# Altium schematic symbol library jlcpcb_2025_04_inductors_extended_0805.schlib: 882 symbols (part 1 of 5)
Pins are listed as number, name and electrical type; pins without a type are passive.

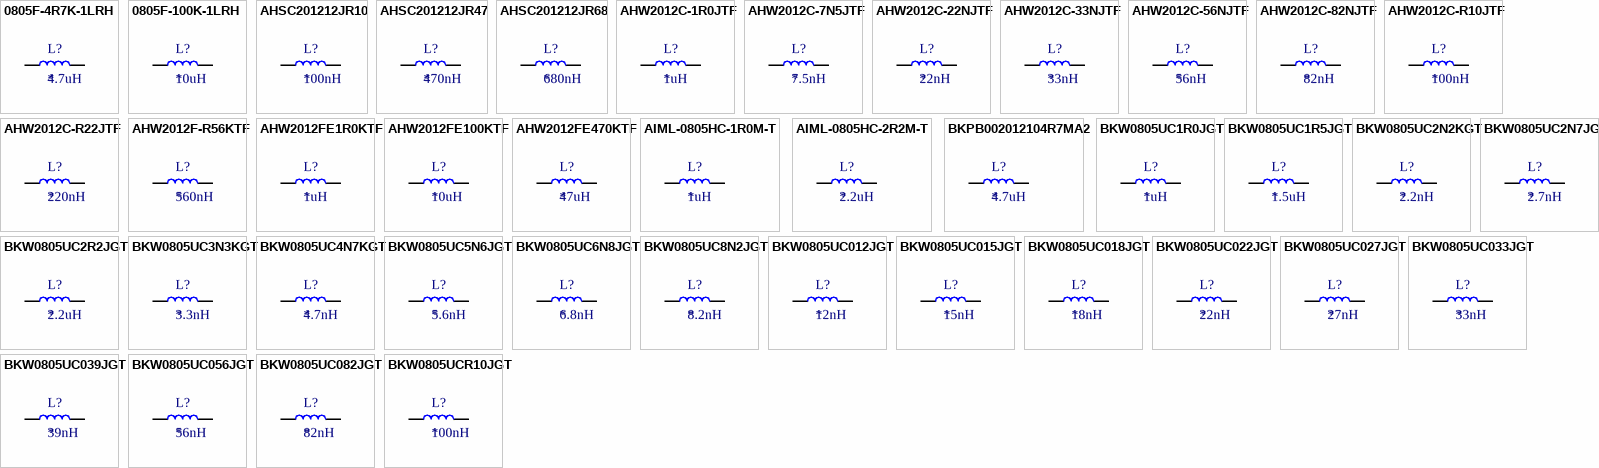
[diagram p0: symbols 0805F-4R7K-1LRH to BKW0805UCR10JGT]

## 0805F-4R7K-1LRH
designator L?  Inductance: 4.7uH
Inductor, 4.7uH, ±10%, 1.87Ω, 280mA, SMD 0805; Manufacturer: PSA(Prosperity Dielectrics); Manufacturer Part Number: 0805F-4R7K-1LRH; Package Size: 0805; JLCPCB Basic Part: No; JLCPCB Part Number: C329433; Supplier 1: LCSC; Category: Inductors; Supplier Part Number 1: C329433; Tolerance: ±10%; Rated Current: 280mA; DC Resistance: 1.87Ω; RoHS: Yes; ComponentLink1Description: Datasheet; ComponentLink1URL: https://wmsc.lcsc.com/wmsc/upload/file/pdf/v2/lcsc/1811151436_PSA-Prosperity-Dielectrics-0805F-4R7K-1LRH_C329433.pdf; ComponentLink2Description: JLCPCB Part URL; ComponentLink2URL: https://jlcpcb.com/partdetail/C329433; ComponentLink3Description: LCSC Part URL; ComponentLink3URL: https://lcsc.com/product-detail/Inductors-SMD_PSAProsperity-Dielectrics-PSAProsperity-Dielectrics-0805F-4R7K-1LRH_C329433.html
footprint IND-0805 (0805 (2012M) Inductor)
pins: 1, 2

## 0805F-100K-1LRH
designator L?  Inductance: 10uH
Inductor, 10uH, ±10%, 3.45Ω, 200mA, SMD 0805; Manufacturer: PSA(Prosperity Dielectrics); Manufacturer Part Number: 0805F-100K-1LRH; Package Size: 0805; JLCPCB Basic Part: No; JLCPCB Part Number: C329432; Supplier 1: LCSC; Category: Inductors; Supplier Part Number 1: C329432; Tolerance: ±10%; Rated Current: 200mA; DC Resistance: 3.45Ω; RoHS: Yes; ComponentLink1Description: Datasheet; ComponentLink1URL: https://wmsc.lcsc.com/wmsc/upload/file/pdf/v2/lcsc/2304140030_PSA-Prosperity-Dielectrics-0805F-100K-1LRH_C329432.pdf; ComponentLink2Description: JLCPCB Part URL; ComponentLink2URL: https://jlcpcb.com/partdetail/C329432; ComponentLink3Description: LCSC Part URL; ComponentLink3URL: https://lcsc.com/product-detail/Inductors-SMD_PSAProsperity-Dielectrics-PSAProsperity-Dielectrics-0805F-100K-1LRH_C329432.html
footprint IND-0805 (0805 (2012M) Inductor)
pins: 1, 2

## AHSC201212JR10
designator L?  Inductance: 100nH
Inductor, 100nH, ±5%, 460mΩ, 400mA, SMD 0805; Manufacturer: COILANK INTERNATIONAL; Manufacturer Part Number: AHSC201212JR10; Self-Resonant Frequency: 1.2GHz; Q Factor: 65@500MHz; Package Size: 0805; JLCPCB Basic Part: No; JLCPCB Part Number: C561731; Supplier 1: LCSC; Category: Inductors; Supplier Part Number 1: C561731; Tolerance: ±5%; Rated Current: 400mA; DC Resistance: 460mΩ; RoHS: Yes; ComponentLink1Description: Datasheet; ComponentLink1URL: https://wmsc.lcsc.com/wmsc/upload/file/pdf/v2/lcsc/2006231007_COILANK-INTERNATIONAL-AHSC201212JR10_C561731.pdf; ComponentLink2Description: JLCPCB Part URL; ComponentLink2URL: https://jlcpcb.com/partdetail/C561731; ComponentLink3Description: LCSC Part URL; ComponentLink3URL: https://lcsc.com/product-detail/Inductors-SMD_COILANK-INTERNATIONAL-COILANK-INTERNATIONAL-AHSC201212JR10_C561731.html
footprint IND-0805 (0805 (2012M) Inductor)
pins: 1, 2

## AHSC201212JR47
designator L?  Inductance: 470nH
Inductor, 470nH, ±5%, 1.76Ω, 250mA, SMD 0805; Manufacturer: COILANK INTERNATIONAL; Manufacturer Part Number: AHSC201212JR47; Self-Resonant Frequency: 375MHz; Q Factor: 30@100MHz; Package Size: 0805; JLCPCB Basic Part: No; JLCPCB Part Number: C561732; Supplier 1: LCSC; Category: Inductors; Supplier Part Number 1: C561732; Tolerance: ±5%; Rated Current: 250mA; DC Resistance: 1.76Ω; RoHS: Yes; ComponentLink1Description: Datasheet; ComponentLink1URL: https://wmsc.lcsc.com/wmsc/upload/file/pdf/v2/lcsc/2006231007_COILANK-INTERNATIONAL-AHSC201212JR47_C561732.pdf; ComponentLink2Description: JLCPCB Part URL; ComponentLink2URL: https://jlcpcb.com/partdetail/C561732; ComponentLink3Description: LCSC Part URL; ComponentLink3URL: https://lcsc.com/product-detail/Inductors-SMD_COILANK-INTERNATIONAL-COILANK-INTERNATIONAL-AHSC201212JR47_C561732.html
footprint IND-0805 (0805 (2012M) Inductor)
pins: 1, 2

## AHSC201212JR68
designator L?  Inductance: 680nH
Inductor, 680nH, ±5%, 2.2Ω, 190mA, SMD 0805; Manufacturer: COILANK INTERNATIONAL; Manufacturer Part Number: AHSC201212JR68; Self-Resonant Frequency: 188MHz; Q Factor: 23@50MHz; Package Size: 0805; JLCPCB Basic Part: No; JLCPCB Part Number: C561733; Supplier 1: LCSC; Category: Inductors; Supplier Part Number 1: C561733; Tolerance: ±5%; Rated Current: 190mA; DC Resistance: 2.2Ω; RoHS: Yes; ComponentLink1Description: Datasheet; ComponentLink1URL: https://wmsc.lcsc.com/wmsc/upload/file/pdf/v2/lcsc/2006231007_COILANK-INTERNATIONAL-AHSC201212JR68_C561733.pdf; ComponentLink2Description: JLCPCB Part URL; ComponentLink2URL: https://jlcpcb.com/partdetail/C561733; ComponentLink3Description: LCSC Part URL; ComponentLink3URL: https://lcsc.com/product-detail/Inductors-SMD_COILANK-INTERNATIONAL-COILANK-INTERNATIONAL-AHSC201212JR68_C561733.html
footprint IND-0805 (0805 (2012M) Inductor)
pins: 1, 2

## AHW2012C-1R0JTF
designator L?  Inductance: 1uH
Inductor, 1uH, ±5%, 2.5Ω, 170mA, SMD 0805; Manufacturer: APV; Manufacturer Part Number: AHW2012C-1R0JTF; Self-Resonant Frequency: 220MHz; Q Factor: 20@50MHz; Package Size: 0805; JLCPCB Basic Part: No; JLCPCB Part Number: C6808030; Supplier 1: LCSC; Category: Inductors; Supplier Part Number 1: C6808030; Tolerance: ±5%; Rated Current: 170mA; DC Resistance: 2.5Ω; RoHS: Yes; ComponentLink1Description: Datasheet; ComponentLink1URL: https://wmsc.lcsc.com/wmsc/upload/file/pdf/v2/lcsc/2306211549_APV-AHW2012C-1R0JTF_C6808030.pdf; ComponentLink2Description: JLCPCB Part URL; ComponentLink2URL: https://jlcpcb.com/partdetail/C6808030; ComponentLink3Description: LCSC Part URL; ComponentLink3URL: https://lcsc.com/product-detail/Inductors-SMD_APV-APV-AHW2012C-1R0JTF_C6808030.html
footprint IND-0805 (0805 (2012M) Inductor)
pins: 1, 2

## AHW2012C-7N5JTF
designator L?  Inductance: 7.5nH
Inductor, 7.5nH, ±5%, 140mΩ, 600mA, SMD 0805; Manufacturer: APV; Manufacturer Part Number: AHW2012C-7N5JTF; Self-Resonant Frequency: 4.8GHz; Q Factor: 50@1GHz; Package Size: 0805; JLCPCB Basic Part: No; JLCPCB Part Number: C6808045; Supplier 1: LCSC; Category: Inductors; Supplier Part Number 1: C6808045; Tolerance: ±5%; Rated Current: 600mA; DC Resistance: 140mΩ; RoHS: Yes; ComponentLink1Description: Datasheet; ComponentLink1URL: https://wmsc.lcsc.com/wmsc/upload/file/pdf/v2/lcsc/2306211549_APV-AHW2012C-7N5JTF_C6808045.pdf; ComponentLink2Description: JLCPCB Part URL; ComponentLink2URL: https://jlcpcb.com/partdetail/C6808045; ComponentLink3Description: LCSC Part URL; ComponentLink3URL: https://lcsc.com/product-detail/Inductors-SMD_APV-APV-AHW2012C-7N5JTF_C6808045.html
footprint IND-0805 (0805 (2012M) Inductor)
pins: 1, 2

## AHW2012C-22NJTF
designator L?  Inductance: 22nH
Inductor, 22nH, ±5%, 220mΩ, 500mA, SMD 0805; Manufacturer: APV; Manufacturer Part Number: AHW2012C-22NJTF; Self-Resonant Frequency: 2.6GHz; Q Factor: 55@500MHz; Package Size: 0805; JLCPCB Basic Part: No; JLCPCB Part Number: C6808033; Supplier 1: LCSC; Category: Inductors; Supplier Part Number 1: C6808033; Tolerance: ±5%; Rated Current: 500mA; DC Resistance: 220mΩ; RoHS: Yes; ComponentLink1Description: Datasheet; ComponentLink1URL: https://wmsc.lcsc.com/wmsc/upload/file/pdf/v2/lcsc/2306211549_APV-AHW2012C-22NJTF_C6808033.pdf; ComponentLink2Description: JLCPCB Part URL; ComponentLink2URL: https://jlcpcb.com/partdetail/C6808033; ComponentLink3Description: LCSC Part URL; ComponentLink3URL: https://lcsc.com/product-detail/Inductors-SMD_APV-APV-AHW2012C-22NJTF_C6808033.html
footprint IND-0805 (0805 (2012M) Inductor)
pins: 1, 2

## AHW2012C-33NJTF
designator L?  Inductance: 33nH
Inductor, 33nH, ±5%, 270mΩ, 500mA, SMD 0805; Manufacturer: APV; Manufacturer Part Number: AHW2012C-33NJTF; Self-Resonant Frequency: 2.15GHz; Q Factor: 60@500MHz; Package Size: 0805; JLCPCB Basic Part: No; JLCPCB Part Number: C6808037; Supplier 1: LCSC; Category: Inductors; Supplier Part Number 1: C6808037; Tolerance: ±5%; Rated Current: 500mA; DC Resistance: 270mΩ; RoHS: Yes; ComponentLink1Description: Datasheet; ComponentLink1URL: https://wmsc.lcsc.com/wmsc/upload/file/pdf/v2/lcsc/2306211549_APV-AHW2012C-33NJTF_C6808037.pdf; ComponentLink2Description: JLCPCB Part URL; ComponentLink2URL: https://jlcpcb.com/partdetail/C6808037; ComponentLink3Description: LCSC Part URL; ComponentLink3URL: https://lcsc.com/product-detail/Inductors-SMD_APV-APV-AHW2012C-33NJTF_C6808037.html
footprint IND-0805 (0805 (2012M) Inductor)
pins: 1, 2

## AHW2012C-56NJTF
designator L?  Inductance: 56nH
Inductor, 56nH, ±5%, 340mΩ, 500mA, SMD 0805; Manufacturer: APV; Manufacturer Part Number: AHW2012C-56NJTF; Self-Resonant Frequency: 1.6GHz; Q Factor: 60@500MHz; Package Size: 0805; JLCPCB Basic Part: No; JLCPCB Part Number: C6808040; Supplier 1: LCSC; Category: Inductors; Supplier Part Number 1: C6808040; Tolerance: ±5%; Rated Current: 500mA; DC Resistance: 340mΩ; RoHS: Yes; ComponentLink1Description: Datasheet; ComponentLink1URL: https://wmsc.lcsc.com/wmsc/upload/file/pdf/v2/lcsc/2306211549_APV-AHW2012C-56NJTF_C6808040.pdf; ComponentLink2Description: JLCPCB Part URL; ComponentLink2URL: https://jlcpcb.com/partdetail/C6808040; ComponentLink3Description: LCSC Part URL; ComponentLink3URL: https://lcsc.com/product-detail/Inductors-SMD_APV-APV-AHW2012C-56NJTF_C6808040.html
footprint IND-0805 (0805 (2012M) Inductor)
pins: 1, 2

## AHW2012C-82NJTF
designator L?  Inductance: 82nH
Inductor, 82nH, ±5%, 420mΩ, 400mA, SMD 0805; Manufacturer: APV; Manufacturer Part Number: AHW2012C-82NJTF; Self-Resonant Frequency: 1.33GHz; Q Factor: 65@500MHz; Package Size: 0805; JLCPCB Basic Part: No; JLCPCB Part Number: C6364713; Supplier 1: LCSC; Category: Inductors; Supplier Part Number 1: C6364713; Tolerance: ±5%; Rated Current: 400mA; DC Resistance: 420mΩ; RoHS: Yes; ComponentLink1Description: Datasheet; ComponentLink1URL: https://wmsc.lcsc.com/wmsc/upload/file/pdf/v2/lcsc/2305231105_APV-AHW2012C-82NJTF_C6364713.pdf; ComponentLink2Description: JLCPCB Part URL; ComponentLink2URL: https://jlcpcb.com/partdetail/C6364713; ComponentLink3Description: LCSC Part URL; ComponentLink3URL: https://lcsc.com/product-detail/Inductors-SMD_APV-APV-AHW2012C-82NJTF_C6364713.html
footprint IND-0805 (0805 (2012M) Inductor)
pins: 1, 2

## AHW2012C-R10JTF
designator L?  Inductance: 100nH
Inductor, 100nH, ±5%, 460mΩ, 400mA, SMD 0805; Manufacturer: APV; Manufacturer Part Number: AHW2012C-R10JTF; Self-Resonant Frequency: 1.25GHz; Q Factor: 65@500MHz; Package Size: 0805; JLCPCB Basic Part: No; JLCPCB Part Number: C6808047; Supplier 1: LCSC; Category: Inductors; Supplier Part Number 1: C6808047; Tolerance: ±5%; Rated Current: 400mA; DC Resistance: 460mΩ; RoHS: Yes; ComponentLink1Description: Datasheet; ComponentLink1URL: https://wmsc.lcsc.com/wmsc/upload/file/pdf/v2/lcsc/2306211549_APV-AHW2012C-R10JTF_C6808047.pdf; ComponentLink2Description: JLCPCB Part URL; ComponentLink2URL: https://jlcpcb.com/partdetail/C6808047; ComponentLink3Description: LCSC Part URL; ComponentLink3URL: https://lcsc.com/product-detail/Inductors-SMD_APV-APV-AHW2012C-R10JTF_C6808047.html
footprint IND-0805 (0805 (2012M) Inductor)
pins: 1, 2

## AHW2012C-R22JTF
designator L?  Inductance: 220nH
Inductor, 220nH, ±5%, 700mΩ, 400mA, SMD 0805; Manufacturer: APV; Manufacturer Part Number: AHW2012C-R22JTF; Self-Resonant Frequency: 820MHz; Q Factor: 50@250MHz; Package Size: 0805; JLCPCB Basic Part: No; JLCPCB Part Number: C6808051; Supplier 1: LCSC; Category: Inductors; Supplier Part Number 1: C6808051; Tolerance: ±5%; Rated Current: 400mA; DC Resistance: 700mΩ; RoHS: Yes; ComponentLink1Description: Datasheet; ComponentLink1URL: https://wmsc.lcsc.com/wmsc/upload/file/pdf/v2/lcsc/2306211549_APV-AHW2012C-R22JTF_C6808051.pdf; ComponentLink2Description: JLCPCB Part URL; ComponentLink2URL: https://jlcpcb.com/partdetail/C6808051; ComponentLink3Description: LCSC Part URL; ComponentLink3URL: https://lcsc.com/product-detail/Inductors-SMD_APV-APV-AHW2012C-R22JTF_C6808051.html
footprint IND-0805 (0805 (2012M) Inductor)
pins: 1, 2

## AHW2012F-R56KTF
designator L?  Inductance: 560nH
Inductor, 560nH, ±10%, 460mΩ, 400mA, SMD 0805; Manufacturer: APV; Manufacturer Part Number: AHW2012F-R56KTF; Self-Resonant Frequency: 400MHz; Q Factor: 12; Package Size: 0805; JLCPCB Basic Part: No; JLCPCB Part Number: C6808062; Supplier 1: LCSC; Category: Inductors; Supplier Part Number 1: C6808062; Tolerance: ±10%; Rated Current: 400mA; DC Resistance: 460mΩ; RoHS: Yes; ComponentLink1Description: Datasheet; ComponentLink1URL: https://wmsc.lcsc.com/wmsc/upload/file/pdf/v2/lcsc/2306211549_APV-AHW2012F-R56KTF_C6808062.pdf; ComponentLink2Description: JLCPCB Part URL; ComponentLink2URL: https://jlcpcb.com/partdetail/C6808062; ComponentLink3Description: LCSC Part URL; ComponentLink3URL: https://lcsc.com/product-detail/Inductors-SMD_APV-APV-AHW2012F-R56KTF_C6808062.html
footprint IND-0805 (0805 (2012M) Inductor)
pins: 1, 2

## AHW2012FE1R0KTF
designator L?  Inductance: 1uH
Inductor, 1uH, ±10%, 169mΩ, 1.35A, SMD 0805; Manufacturer: APV; Manufacturer Part Number: AHW2012FE1R0KTF; Self-Resonant Frequency: 208MHz; Q Factor: 14; Package Size: 0805; JLCPCB Basic Part: No; JLCPCB Part Number: C6364732; Supplier 1: LCSC; Category: Inductors; Supplier Part Number 1: C6364732; Tolerance: ±10%; Rated Current: 1.35A; DC Resistance: 169mΩ; RoHS: Yes; ComponentLink1Description: Datasheet; ComponentLink1URL: https://wmsc.lcsc.com/wmsc/upload/file/pdf/v2/lcsc/2308041746_APV-AHW2012FE1R0KTF_C6364732.pdf; ComponentLink2Description: JLCPCB Part URL; ComponentLink2URL: https://jlcpcb.com/partdetail/C6364732; ComponentLink3Description: LCSC Part URL; ComponentLink3URL: https://lcsc.com/product-detail/Inductors-SMD_APV-APV-AHW2012FE1R0KTF_C6364732.html
footprint IND-0805 (0805 (2012M) Inductor)
pins: 1, 2

## AHW2012FE100KTF
designator L?  Inductance: 10uH
Inductor, 10uH, ±10%, 1.17Ω, 560mA, SMD 0805; Manufacturer: APV; Manufacturer Part Number: AHW2012FE100KTF; Self-Resonant Frequency: 25MHz; Q Factor: 14; Package Size: 0805; JLCPCB Basic Part: No; JLCPCB Part Number: C6364730; Supplier 1: LCSC; Category: Inductors; Supplier Part Number 1: C6364730; Tolerance: ±10%; Rated Current: 560mA; DC Resistance: 1.17Ω; RoHS: Yes; ComponentLink1Description: Datasheet; ComponentLink1URL: https://wmsc.lcsc.com/wmsc/upload/file/pdf/v2/lcsc/2308041746_APV-AHW2012FE100KTF_C6364730.pdf; ComponentLink2Description: JLCPCB Part URL; ComponentLink2URL: https://jlcpcb.com/partdetail/C6364730; ComponentLink3Description: LCSC Part URL; ComponentLink3URL: https://lcsc.com/product-detail/Inductors-SMD_APV-APV-AHW2012FE100KTF_C6364730.html
footprint IND-0805 (0805 (2012M) Inductor)
pins: 1, 2

## AHW2012FE470KTF
designator L?  Inductance: 47uH
Inductor, 47uH, ±10%, 4.42Ω, 280mA, SMD 0805; Manufacturer: APV; Manufacturer Part Number: AHW2012FE470KTF; Self-Resonant Frequency: 15MHz; Q Factor: 14; Package Size: 0805; JLCPCB Basic Part: No; JLCPCB Part Number: C6364735; Supplier 1: LCSC; Category: Inductors; Supplier Part Number 1: C6364735; Tolerance: ±10%; Rated Current: 280mA; DC Resistance: 4.42Ω; RoHS: Yes; ComponentLink1Description: Datasheet; ComponentLink1URL: https://wmsc.lcsc.com/wmsc/upload/file/pdf/v2/lcsc/2308041746_APV-AHW2012FE470KTF_C6364735.pdf; ComponentLink2Description: JLCPCB Part URL; ComponentLink2URL: https://jlcpcb.com/partdetail/C6364735; ComponentLink3Description: LCSC Part URL; ComponentLink3URL: https://lcsc.com/product-detail/Inductors-SMD_APV-APV-AHW2012FE470KTF_C6364735.html
footprint IND-0805 (0805 (2012M) Inductor)
pins: 1, 2

## AIML-0805HC-1R0M-T
designator L?  Inductance: 1uH
Inductor, 1uH, ±20%, 150mΩ, SMD 0805; Manufacturer: Abracon LLC; Manufacturer Part Number: AIML-0805HC-1R0M-T; Saturation Current: 400mA; Self-Resonant Frequency: 75MHz; Package Size: 0805; JLCPCB Basic Part: No; JLCPCB Part Number: C2044214; Supplier 1: LCSC; Category: Inductors; Supplier Part Number 1: C2044214; Tolerance: ±20%; DC Resistance: 150mΩ; RoHS: Yes; ComponentLink1Description: Datasheet; ComponentLink1URL: https://wmsc.lcsc.com/wmsc/upload/file/pdf/v2/lcsc/2304140030_Abracon-LLC-AIML-0805HC-1R0M-T_C2044214.pdf; ComponentLink2Description: JLCPCB Part URL; ComponentLink2URL: https://jlcpcb.com/partdetail/C2044214; ComponentLink3Description: LCSC Part URL; ComponentLink3URL: https://lcsc.com/product-detail/Inductors-SMD_Abracon-LLC-Abracon-LLC-AIML-0805HC-1R0M-T_C2044214.html
footprint IND-0805 (0805 (2012M) Inductor)
pins: 1, 2

## AIML-0805HC-2R2M-T
designator L?  Inductance: 2.2uH
Inductor, 2.2uH, ±20%, 200mΩ, 1.2A, SMD 0805; Manufacturer: Abracon LLC; Manufacturer Part Number: AIML-0805HC-2R2M-T; Saturation Current: 150mA; Self-Resonant Frequency: 50MHz; Package Size: 0805; JLCPCB Basic Part: No; JLCPCB Part Number: C193676; Supplier 1: LCSC; Category: Inductors; Supplier Part Number 1: C193676; Tolerance: ±20%; Rated Current: 1.2A; DC Resistance: 200mΩ; RoHS: Yes; ComponentLink1Description: Datasheet; ComponentLink1URL: https://wmsc.lcsc.com/wmsc/upload/file/pdf/v2/lcsc/1809291530_Abracon-LLC-AIML-0805HC-2R2M-T_C193676.pdf; ComponentLink2Description: JLCPCB Part URL; ComponentLink2URL: https://jlcpcb.com/partdetail/C193676; ComponentLink3Description: LCSC Part URL; ComponentLink3URL: https://lcsc.com/product-detail/Inductors-SMD_Abracon-LLC-Abracon-LLC-AIML-0805HC-2R2M-T_C193676.html
footprint IND-0805 (0805 (2012M) Inductor)
pins: 1, 2

## BKPB002012104R7MA2
designator L?  Inductance: 4.7uH
Inductor, 4.7uH, ±20%, SMD 0805; Manufacturer: Chilisin Elec; Manufacturer Part Number: BKPB002012104R7MA2; Package Size: 0805; JLCPCB Basic Part: No; JLCPCB Part Number: C2981203; Supplier 1: LCSC; Category: Inductors; Supplier Part Number 1: C2981203; Tolerance: ±20%; RoHS: Yes; ComponentLink1Description: Datasheet; ComponentLink1URL: https://wmsc.lcsc.com/wmsc/upload/file/pdf/v2/lcsc/2203101903_Chilisin-Elec-BKPB002012104R7MA2_C2981203.pdf; ComponentLink2Description: JLCPCB Part URL; ComponentLink2URL: https://jlcpcb.com/partdetail/C2981203; ComponentLink3Description: LCSC Part URL; ComponentLink3URL: https://lcsc.com/product-detail/Inductors-SMD_Chilisin-Elec-Chilisin-Elec-BKPB002012104R7MA2_C2981203.html
footprint IND-0805 (0805 (2012M) Inductor)
pins: 1, 2

## BKW0805UC1R0JGT
designator L?  Inductance: 1uH
Inductor, 1uH, ±5%, 2.4Ω, 170mA, SMD 0805; Manufacturer: FH-BK(Guangdong Fenghua Bangke Elec); Manufacturer Part Number: BKW0805UC1R0JGT; Package Size: 0805; JLCPCB Basic Part: No; JLCPCB Part Number: C98537; Supplier 1: LCSC; Category: Inductors; Supplier Part Number 1: C98537; Tolerance: ±5%; Rated Current: 170mA; DC Resistance: 2.4Ω; RoHS: Yes; ComponentLink1Description: Datasheet; ComponentLink1URL: https://wmsc.lcsc.com/wmsc/upload/file/pdf/v2/lcsc/2304140030_FH-BK-Guangdong-Fenghua-Bangke-Elec-BKW0805UC1R0JGT_C98537.pdf; ComponentLink2Description: JLCPCB Part URL; ComponentLink2URL: https://jlcpcb.com/partdetail/C98537; ComponentLink3Description: LCSC Part URL; ComponentLink3URL: https://lcsc.com/product-detail/Inductors-SMD_FH-BKGuangdong-Fenghua-Bangke-Elec-FH-BKGuangdong-Fenghua-Bangke-Elec-BKW0805UC1R0JGT_C98537.html
footprint IND-0805 (0805 (2012M) Inductor)
pins: 1, 2

## BKW0805UC1R5JGT
designator L?  Inductance: 1.5uH
Inductor, 1.5uH, ±5%, 2.8Ω, 160mA, SMD 0805; Manufacturer: FH-BK(Guangdong Fenghua Bangke Elec); Manufacturer Part Number: BKW0805UC1R5JGT; Package Size: 0805; JLCPCB Basic Part: No; JLCPCB Part Number: C147306; Supplier 1: LCSC; Category: Inductors; Supplier Part Number 1: C147306; Tolerance: ±5%; Rated Current: 160mA; DC Resistance: 2.8Ω; RoHS: Yes; ComponentLink1Description: Datasheet; ComponentLink1URL: https://wmsc.lcsc.com/wmsc/upload/file/pdf/v2/lcsc/2304140030_FH-BK-Guangdong-Fenghua-Bangke-Elec-BKW0805UC1R5JGT_C147306.pdf; ComponentLink2Description: JLCPCB Part URL; ComponentLink2URL: https://jlcpcb.com/partdetail/C147306; ComponentLink3Description: LCSC Part URL; ComponentLink3URL: https://lcsc.com/product-detail/Inductors-SMD_FH-BKGuangdong-Fenghua-Bangke-Elec-FH-BKGuangdong-Fenghua-Bangke-Elec-BKW0805UC1R5JGT_C147306.html
footprint IND-0805 (0805 (2012M) Inductor)
pins: 1, 2

## BKW0805UC2N2KGT
designator L?  Inductance: 2.2nH
Inductor, 2.2nH, ±10%, 30mΩ, 800mA, SMD 0805; Manufacturer: FH-BK(Guangdong Fenghua Bangke Elec); Manufacturer Part Number: BKW0805UC2N2KGT; Package Size: 0805; JLCPCB Basic Part: No; JLCPCB Part Number: C316241; Supplier 1: LCSC; Category: Inductors; Supplier Part Number 1: C316241; Tolerance: ±10%; Rated Current: 800mA; DC Resistance: 30mΩ; RoHS: Yes; ComponentLink1Description: Datasheet; ComponentLink1URL: https://wmsc.lcsc.com/wmsc/upload/file/pdf/v2/lcsc/2304140030_FH-BK-Guangdong-Fenghua-Bangke-Elec-BKW0805UC2N2KGT_C316241.pdf; ComponentLink2Description: JLCPCB Part URL; ComponentLink2URL: https://jlcpcb.com/partdetail/C316241; ComponentLink3Description: LCSC Part URL; ComponentLink3URL: https://lcsc.com/product-detail/Inductors-SMD_FH-BKGuangdong-Fenghua-Bangke-Elec-FH-BKGuangdong-Fenghua-Bangke-Elec-BKW0805UC2N2KGT_C316241.html
footprint IND-0805 (0805 (2012M) Inductor)
pins: 1, 2

## BKW0805UC2N7JGT
designator L?  Inductance: 2.7nH
Inductor, 2.7nH, ±5%, 45mΩ, 800mA, SMD 0805; Manufacturer: FH-BK(Guangdong Fenghua Bangke Elec); Manufacturer Part Number: BKW0805UC2N7JGT; Package Size: 0805; JLCPCB Basic Part: No; JLCPCB Part Number: C98530; Supplier 1: LCSC; Category: Inductors; Supplier Part Number 1: C98530; Tolerance: ±5%; Rated Current: 800mA; DC Resistance: 45mΩ; RoHS: Yes; ComponentLink1Description: Datasheet; ComponentLink1URL: https://wmsc.lcsc.com/wmsc/upload/file/pdf/v2/lcsc/2304140030_FH-BK-Guangdong-Fenghua-Bangke-Elec-BKW0805UC2N7JGT_C98530.pdf; ComponentLink2Description: JLCPCB Part URL; ComponentLink2URL: https://jlcpcb.com/partdetail/C98530; ComponentLink3Description: LCSC Part URL; ComponentLink3URL: https://lcsc.com/product-detail/Inductors-SMD_FH-BKGuangdong-Fenghua-Bangke-Elec-FH-BKGuangdong-Fenghua-Bangke-Elec-BKW0805UC2N7JGT_C98530.html
footprint IND-0805 (0805 (2012M) Inductor)
pins: 1, 2

## BKW0805UC2R2JGT
designator L?  Inductance: 2.2uH
Inductor, 2.2uH, ±5%, 4.2Ω, 150mA, SMD 0805; Manufacturer: FH-BK(Guangdong Fenghua Bangke Elec); Manufacturer Part Number: BKW0805UC2R2JGT; Package Size: 0805; JLCPCB Basic Part: No; JLCPCB Part Number: C361664; Supplier 1: LCSC; Category: Inductors; Supplier Part Number 1: C361664; Tolerance: ±5%; Rated Current: 150mA; DC Resistance: 4.2Ω; RoHS: Yes; ComponentLink1Description: Datasheet; ComponentLink1URL: https://wmsc.lcsc.com/wmsc/upload/file/pdf/v2/lcsc/2304140030_FH-BK-Guangdong-Fenghua-Bangke-Elec-BKW0805UC2R2JGT_C361664.pdf; ComponentLink2Description: JLCPCB Part URL; ComponentLink2URL: https://jlcpcb.com/partdetail/C361664; ComponentLink3Description: LCSC Part URL; ComponentLink3URL: https://lcsc.com/product-detail/Inductors-SMD_FH-BKGuangdong-Fenghua-Bangke-Elec-FH-BKGuangdong-Fenghua-Bangke-Elec-BKW0805UC2R2JGT_C361664.html
footprint IND-0805 (0805 (2012M) Inductor)
pins: 1, 2

## BKW0805UC3N3KGT
designator L?  Inductance: 3.3nH
Inductor, 3.3nH, ±10%, 90mΩ, 600mA, SMD 0805; Manufacturer: FH-BK(Guangdong Fenghua Bangke Elec); Manufacturer Part Number: BKW0805UC3N3KGT; Package Size: 0805; JLCPCB Basic Part: No; JLCPCB Part Number: C98538; Supplier 1: LCSC; Category: Inductors; Supplier Part Number 1: C98538; Tolerance: ±10%; Rated Current: 600mA; DC Resistance: 90mΩ; RoHS: Yes; ComponentLink1Description: Datasheet; ComponentLink1URL: https://wmsc.lcsc.com/wmsc/upload/file/pdf/v2/lcsc/2304140030_FH-BK-Guangdong-Fenghua-Bangke-Elec-BKW0805UC3N3KGT_C98538.pdf; ComponentLink2Description: JLCPCB Part URL; ComponentLink2URL: https://jlcpcb.com/partdetail/C98538; ComponentLink3Description: LCSC Part URL; ComponentLink3URL: https://lcsc.com/product-detail/Inductors-SMD_FH-BKGuangdong-Fenghua-Bangke-Elec-FH-BKGuangdong-Fenghua-Bangke-Elec-BKW0805UC3N3KGT_C98538.html
footprint IND-0805 (0805 (2012M) Inductor)
pins: 1, 2

## BKW0805UC4N7KGT
designator L?  Inductance: 4.7nH
Inductor, 4.7nH, ±10%, 50mΩ, 600mA, SMD 0805; Manufacturer: FH-BK(Guangdong Fenghua Bangke Elec); Manufacturer Part Number: BKW0805UC4N7KGT; Package Size: 0805; JLCPCB Basic Part: No; JLCPCB Part Number: C98540; Supplier 1: LCSC; Category: Inductors; Supplier Part Number 1: C98540; Tolerance: ±10%; Rated Current: 600mA; DC Resistance: 50mΩ; RoHS: Yes; ComponentLink1Description: Datasheet; ComponentLink1URL: https://wmsc.lcsc.com/wmsc/upload/file/pdf/v2/lcsc/2304140030_FH-BK-Guangdong-Fenghua-Bangke-Elec-BKW0805UC4N7KGT_C98540.pdf; ComponentLink2Description: JLCPCB Part URL; ComponentLink2URL: https://jlcpcb.com/partdetail/C98540; ComponentLink3Description: LCSC Part URL; ComponentLink3URL: https://lcsc.com/product-detail/Inductors-SMD_FH-BKGuangdong-Fenghua-Bangke-Elec-FH-BKGuangdong-Fenghua-Bangke-Elec-BKW0805UC4N7KGT_C98540.html
footprint IND-0805 (0805 (2012M) Inductor)
pins: 1, 2

## BKW0805UC5N6JGT
designator L?  Inductance: 5.6nH
Inductor, 5.6nH, ±5%, 650mΩ, 600mA, SMD 0805; Manufacturer: FH-BK(Guangdong Fenghua Bangke Elec); Manufacturer Part Number: BKW0805UC5N6JGT; Package Size: 0805; JLCPCB Basic Part: No; JLCPCB Part Number: C98531; Supplier 1: LCSC; Category: Inductors; Supplier Part Number 1: C98531; Tolerance: ±5%; Rated Current: 600mA; DC Resistance: 650mΩ; RoHS: Yes; ComponentLink1Description: Datasheet; ComponentLink1URL: https://wmsc.lcsc.com/wmsc/upload/file/pdf/v2/lcsc/2304140030_FH-BK-Guangdong-Fenghua-Bangke-Elec-BKW0805UC5N6JGT_C98531.pdf; ComponentLink2Description: JLCPCB Part URL; ComponentLink2URL: https://jlcpcb.com/partdetail/C98531; ComponentLink3Description: LCSC Part URL; ComponentLink3URL: https://lcsc.com/product-detail/Inductors-SMD_FH-BKGuangdong-Fenghua-Bangke-Elec-FH-BKGuangdong-Fenghua-Bangke-Elec-BKW0805UC5N6JGT_C98531.html
footprint IND-0805 (0805 (2012M) Inductor)
pins: 1, 2

## BKW0805UC6N8JGT
designator L?  Inductance: 6.8nH
Inductor, 6.8nH, ±5%, 110mΩ, 600mA, SMD 0805; Manufacturer: FH-BK(Guangdong Fenghua Bangke Elec); Manufacturer Part Number: BKW0805UC6N8JGT; Package Size: 0805; JLCPCB Basic Part: No; JLCPCB Part Number: C98541; Supplier 1: LCSC; Category: Inductors; Supplier Part Number 1: C98541; Tolerance: ±5%; Rated Current: 600mA; DC Resistance: 110mΩ; RoHS: Yes; ComponentLink1Description: Datasheet; ComponentLink1URL: https://wmsc.lcsc.com/wmsc/upload/file/pdf/v2/lcsc/2304140030_FH-BK-Guangdong-Fenghua-Bangke-Elec-BKW0805UC6N8JGT_C98541.pdf; ComponentLink2Description: JLCPCB Part URL; ComponentLink2URL: https://jlcpcb.com/partdetail/C98541; ComponentLink3Description: LCSC Part URL; ComponentLink3URL: https://lcsc.com/product-detail/Inductors-SMD_FH-BKGuangdong-Fenghua-Bangke-Elec-FH-BKGuangdong-Fenghua-Bangke-Elec-BKW0805UC6N8JGT_C98541.html
footprint IND-0805 (0805 (2012M) Inductor)
pins: 1, 2

## BKW0805UC8N2JGT
designator L?  Inductance: 8.2nH
Inductor, 8.2nH, ±5%, 200mΩ, 600mA, SMD 0805; Manufacturer: FH-BK(Guangdong Fenghua Bangke Elec); Manufacturer Part Number: BKW0805UC8N2JGT; Package Size: 0805; JLCPCB Basic Part: No; JLCPCB Part Number: C98542; Supplier 1: LCSC; Category: Inductors; Supplier Part Number 1: C98542; Tolerance: ±5%; Rated Current: 600mA; DC Resistance: 200mΩ; RoHS: Yes; ComponentLink1Description: Datasheet; ComponentLink1URL: https://wmsc.lcsc.com/wmsc/upload/file/pdf/v2/lcsc/2304140030_FH-BK-Guangdong-Fenghua-Bangke-Elec-BKW0805UC8N2JGT_C98542.pdf; ComponentLink2Description: JLCPCB Part URL; ComponentLink2URL: https://jlcpcb.com/partdetail/C98542; ComponentLink3Description: LCSC Part URL; ComponentLink3URL: https://lcsc.com/product-detail/Inductors-SMD_FH-BKGuangdong-Fenghua-Bangke-Elec-FH-BKGuangdong-Fenghua-Bangke-Elec-BKW0805UC8N2JGT_C98542.html
footprint IND-0805 (0805 (2012M) Inductor)
pins: 1, 2

## BKW0805UC012JGT
designator L?  Inductance: 12nH
Inductor, 12nH, ±5%, 150mΩ, 600mA, SMD 0805; Manufacturer: FH-BK(Guangdong Fenghua Bangke Elec); Manufacturer Part Number: BKW0805UC012JGT; Package Size: 0805; JLCPCB Basic Part: No; JLCPCB Part Number: C107472; Supplier 1: LCSC; Category: Inductors; Supplier Part Number 1: C107472; Tolerance: ±5%; Rated Current: 600mA; DC Resistance: 150mΩ; RoHS: Yes; ComponentLink1Description: Datasheet; ComponentLink1URL: https://wmsc.lcsc.com/wmsc/upload/file/pdf/v2/lcsc/2304140030_FH-BK-Guangdong-Fenghua-Bangke-Elec-BKW0805UC012JGT_C107472.pdf; ComponentLink2Description: JLCPCB Part URL; ComponentLink2URL: https://jlcpcb.com/partdetail/C107472; ComponentLink3Description: LCSC Part URL; ComponentLink3URL: https://lcsc.com/product-detail/Inductors-SMD_FH-BKGuangdong-Fenghua-Bangke-Elec-FH-BKGuangdong-Fenghua-Bangke-Elec-BKW0805UC012JGT_C107472.html
footprint IND-0805 (0805 (2012M) Inductor)
pins: 1, 2

## BKW0805UC015JGT
designator L?  Inductance: 15nH
Inductor, 15nH, ±5%, 170mΩ, 600mA, SMD 0805; Manufacturer: FH-BK(Guangdong Fenghua Bangke Elec); Manufacturer Part Number: BKW0805UC015JGT; Package Size: 0805; JLCPCB Basic Part: No; JLCPCB Part Number: C107468; Supplier 1: LCSC; Category: Inductors; Supplier Part Number 1: C107468; Tolerance: ±5%; Rated Current: 600mA; DC Resistance: 170mΩ; RoHS: Yes; ComponentLink1Description: Datasheet; ComponentLink1URL: https://wmsc.lcsc.com/wmsc/upload/file/pdf/v2/lcsc/2304140030_FH-BK-Guangdong-Fenghua-Bangke-Elec-BKW0805UC015JGT_C107468.pdf; ComponentLink2Description: JLCPCB Part URL; ComponentLink2URL: https://jlcpcb.com/partdetail/C107468; ComponentLink3Description: LCSC Part URL; ComponentLink3URL: https://lcsc.com/product-detail/Inductors-SMD_FH-BKGuangdong-Fenghua-Bangke-Elec-FH-BKGuangdong-Fenghua-Bangke-Elec-BKW0805UC015JGT_C107468.html
footprint IND-0805 (0805 (2012M) Inductor)
pins: 1, 2

## BKW0805UC018JGT
designator L?  Inductance: 18nH
Inductor, 18nH, ±5%, 200mΩ, 600mA, SMD 0805; Manufacturer: FH-BK(Guangdong Fenghua Bangke Elec); Manufacturer Part Number: BKW0805UC018JGT; Package Size: 0805; JLCPCB Basic Part: No; JLCPCB Part Number: C107473; Supplier 1: LCSC; Category: Inductors; Supplier Part Number 1: C107473; Tolerance: ±5%; Rated Current: 600mA; DC Resistance: 200mΩ; RoHS: Yes; ComponentLink1Description: Datasheet; ComponentLink1URL: https://wmsc.lcsc.com/wmsc/upload/file/pdf/v2/lcsc/2304140030_FH-BK-Guangdong-Fenghua-Bangke-Elec-BKW0805UC018JGT_C107473.pdf; ComponentLink2Description: JLCPCB Part URL; ComponentLink2URL: https://jlcpcb.com/partdetail/C107473; ComponentLink3Description: LCSC Part URL; ComponentLink3URL: https://lcsc.com/product-detail/Inductors-SMD_FH-BKGuangdong-Fenghua-Bangke-Elec-FH-BKGuangdong-Fenghua-Bangke-Elec-BKW0805UC018JGT_C107473.html
footprint IND-0805 (0805 (2012M) Inductor)
pins: 1, 2

## BKW0805UC022JGT
designator L?  Inductance: 22nH
Inductor, 22nH, ±5%, 220mΩ, 500mA, SMD 0805; Manufacturer: FH-BK(Guangdong Fenghua Bangke Elec); Manufacturer Part Number: BKW0805UC022JGT; Package Size: 0805; JLCPCB Basic Part: No; JLCPCB Part Number: C107467; Supplier 1: LCSC; Category: Inductors; Supplier Part Number 1: C107467; Tolerance: ±5%; Rated Current: 500mA; DC Resistance: 220mΩ; RoHS: Yes; ComponentLink1Description: Datasheet; ComponentLink1URL: https://wmsc.lcsc.com/wmsc/upload/file/pdf/v2/lcsc/2304140030_FH-BK-Guangdong-Fenghua-Bangke-Elec-BKW0805UC022JGT_C107467.pdf; ComponentLink2Description: JLCPCB Part URL; ComponentLink2URL: https://jlcpcb.com/partdetail/C107467; ComponentLink3Description: LCSC Part URL; ComponentLink3URL: https://lcsc.com/product-detail/Inductors-SMD_FH-BKGuangdong-Fenghua-Bangke-Elec-FH-BKGuangdong-Fenghua-Bangke-Elec-BKW0805UC022JGT_C107467.html
footprint IND-0805 (0805 (2012M) Inductor)
pins: 1, 2

## BKW0805UC027JGT
designator L?  Inductance: 27nH
Inductor, 27nH, ±5%, 250mΩ, 500mA, SMD 0805; Manufacturer: FH-BK(Guangdong Fenghua Bangke Elec); Manufacturer Part Number: BKW0805UC027JGT; Package Size: 0805; JLCPCB Basic Part: No; JLCPCB Part Number: C107474; Supplier 1: LCSC; Category: Inductors; Supplier Part Number 1: C107474; Tolerance: ±5%; Rated Current: 500mA; DC Resistance: 250mΩ; RoHS: Yes; ComponentLink1Description: Datasheet; ComponentLink1URL: https://wmsc.lcsc.com/wmsc/upload/file/pdf/v2/lcsc/2304140030_FH-BK-Guangdong-Fenghua-Bangke-Elec-BKW0805UC027JGT_C107474.pdf; ComponentLink2Description: JLCPCB Part URL; ComponentLink2URL: https://jlcpcb.com/partdetail/C107474; ComponentLink3Description: LCSC Part URL; ComponentLink3URL: https://lcsc.com/product-detail/Inductors-SMD_FH-BKGuangdong-Fenghua-Bangke-Elec-FH-BKGuangdong-Fenghua-Bangke-Elec-BKW0805UC027JGT_C107474.html
footprint IND-0805 (0805 (2012M) Inductor)
pins: 1, 2

## BKW0805UC033JGT
designator L?  Inductance: 33nH
Inductor, 33nH, ±5%, 270mΩ, 500mA, SMD 0805; Manufacturer: FH-BK(Guangdong Fenghua Bangke Elec); Manufacturer Part Number: BKW0805UC033JGT; Package Size: 0805; JLCPCB Basic Part: No; JLCPCB Part Number: C98532; Supplier 1: LCSC; Category: Inductors; Supplier Part Number 1: C98532; Tolerance: ±5%; Rated Current: 500mA; DC Resistance: 270mΩ; RoHS: Yes; ComponentLink1Description: Datasheet; ComponentLink1URL: https://wmsc.lcsc.com/wmsc/upload/file/pdf/v2/lcsc/2304140030_FH-BK-Guangdong-Fenghua-Bangke-Elec-BKW0805UC033JGT_C98532.pdf; ComponentLink2Description: JLCPCB Part URL; ComponentLink2URL: https://jlcpcb.com/partdetail/C98532; ComponentLink3Description: LCSC Part URL; ComponentLink3URL: https://lcsc.com/product-detail/Inductors-SMD_FH-BKGuangdong-Fenghua-Bangke-Elec-FH-BKGuangdong-Fenghua-Bangke-Elec-BKW0805UC033JGT_C98532.html
footprint IND-0805 (0805 (2012M) Inductor)
pins: 1, 2

## BKW0805UC039JGT
designator L?  Inductance: 39nH
Inductor, 39nH, ±5%, 290mΩ, 500mA, SMD 0805; Manufacturer: FH-BK(Guangdong Fenghua Bangke Elec); Manufacturer Part Number: BKW0805UC039JGT; Package Size: 0805; JLCPCB Basic Part: No; JLCPCB Part Number: C107475; Supplier 1: LCSC; Category: Inductors; Supplier Part Number 1: C107475; Tolerance: ±5%; Rated Current: 500mA; DC Resistance: 290mΩ; RoHS: Yes; ComponentLink1Description: Datasheet; ComponentLink1URL: https://wmsc.lcsc.com/wmsc/upload/file/pdf/v2/lcsc/2304140030_FH-BK-Guangdong-Fenghua-Bangke-Elec-BKW0805UC039JGT_C107475.pdf; ComponentLink2Description: JLCPCB Part URL; ComponentLink2URL: https://jlcpcb.com/partdetail/C107475; ComponentLink3Description: LCSC Part URL; ComponentLink3URL: https://lcsc.com/product-detail/Inductors-SMD_FH-BKGuangdong-Fenghua-Bangke-Elec-FH-BKGuangdong-Fenghua-Bangke-Elec-BKW0805UC039JGT_C107475.html
footprint IND-0805 (0805 (2012M) Inductor)
pins: 1, 2

## BKW0805UC056JGT
designator L?  Inductance: 56nH
Inductor, 56nH, ±5%, 340mΩ, 500mA, SMD 0805; Manufacturer: FH-BK(Guangdong Fenghua Bangke Elec); Manufacturer Part Number: BKW0805UC056JGT; Package Size: 0805; JLCPCB Basic Part: No; JLCPCB Part Number: C98534; Supplier 1: LCSC; Category: Inductors; Supplier Part Number 1: C98534; Tolerance: ±5%; Rated Current: 500mA; DC Resistance: 340mΩ; RoHS: Yes; ComponentLink1Description: Datasheet; ComponentLink1URL: https://wmsc.lcsc.com/wmsc/upload/file/pdf/v2/lcsc/2304140030_FH-BK-Guangdong-Fenghua-Bangke-Elec-BKW0805UC056JGT_C98534.pdf; ComponentLink2Description: JLCPCB Part URL; ComponentLink2URL: https://jlcpcb.com/partdetail/C98534; ComponentLink3Description: LCSC Part URL; ComponentLink3URL: https://lcsc.com/product-detail/Inductors-SMD_FH-BKGuangdong-Fenghua-Bangke-Elec-FH-BKGuangdong-Fenghua-Bangke-Elec-BKW0805UC056JGT_C98534.html
footprint IND-0805 (0805 (2012M) Inductor)
pins: 1, 2

## BKW0805UC082JGT
designator L?  Inductance: 82nH
Inductor, 82nH, ±5%, 420mΩ, 400mA, SMD 0805; Manufacturer: FH-BK(Guangdong Fenghua Bangke Elec); Manufacturer Part Number: BKW0805UC082JGT; Package Size: 0805; JLCPCB Basic Part: No; JLCPCB Part Number: C98543; Supplier 1: LCSC; Category: Inductors; Supplier Part Number 1: C98543; Tolerance: ±5%; Rated Current: 400mA; DC Resistance: 420mΩ; RoHS: Yes; ComponentLink1Description: Datasheet; ComponentLink1URL: https://wmsc.lcsc.com/wmsc/upload/file/pdf/v2/lcsc/2304140030_FH-BK-Guangdong-Fenghua-Bangke-Elec-BKW0805UC082JGT_C98543.pdf; ComponentLink2Description: JLCPCB Part URL; ComponentLink2URL: https://jlcpcb.com/partdetail/C98543; ComponentLink3Description: LCSC Part URL; ComponentLink3URL: https://lcsc.com/product-detail/Inductors-SMD_FH-BKGuangdong-Fenghua-Bangke-Elec-FH-BKGuangdong-Fenghua-Bangke-Elec-BKW0805UC082JGT_C98543.html
footprint IND-0805 (0805 (2012M) Inductor)
pins: 1, 2

## BKW0805UCR10JGT
designator L?  Inductance: 100nH
Inductor, 100nH, ±5%, 460mΩ, 400mA, SMD 0805; Manufacturer: FH-BK(Guangdong Fenghua Bangke Elec); Manufacturer Part Number: BKW0805UCR10JGT; Package Size: 0805; JLCPCB Basic Part: No; JLCPCB Part Number: C147305; Supplier 1: LCSC; Category: Inductors; Supplier Part Number 1: C147305; Tolerance: ±5%; Rated Current: 400mA; DC Resistance: 460mΩ; RoHS: Yes; ComponentLink1Description: Datasheet; ComponentLink1URL: https://wmsc.lcsc.com/wmsc/upload/file/pdf/v2/lcsc/2304140030_FH-BK-Guangdong-Fenghua-Bangke-Elec-BKW0805UCR10JGT_C147305.pdf; ComponentLink2Description: JLCPCB Part URL; ComponentLink2URL: https://jlcpcb.com/partdetail/C147305; ComponentLink3Description: LCSC Part URL; ComponentLink3URL: https://lcsc.com/product-detail/Inductors-SMD_FH-BKGuangdong-Fenghua-Bangke-Elec-FH-BKGuangdong-Fenghua-Bangke-Elec-BKW0805UCR10JGT_C147305.html
footprint IND-0805 (0805 (2012M) Inductor)
pins: 1, 2

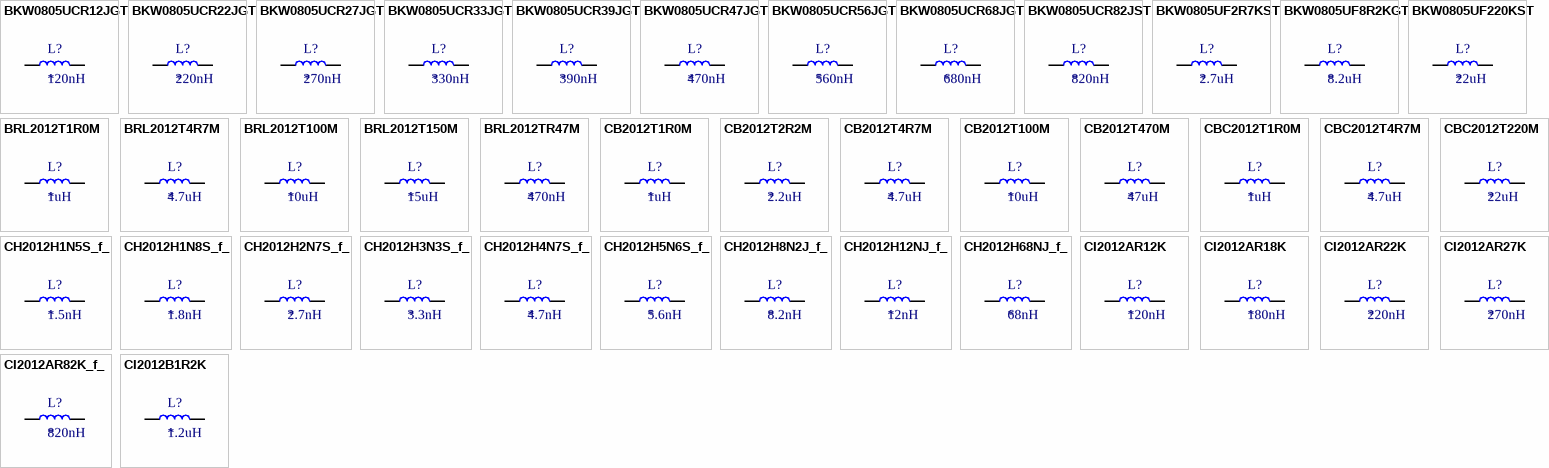
[diagram p1: symbols BKW0805UCR12JGT to CI2012B1R2K]

## BKW0805UCR12JGT
designator L?  Inductance: 120nH
Inductor, 120nH, ±5%, 510mΩ, 400mA, SMD 0805; Manufacturer: FH-BK(Guangdong Fenghua Bangke Elec); Manufacturer Part Number: BKW0805UCR12JGT; Package Size: 0805; JLCPCB Basic Part: No; JLCPCB Part Number: C98546; Supplier 1: LCSC; Category: Inductors; Supplier Part Number 1: C98546; Tolerance: ±5%; Rated Current: 400mA; DC Resistance: 510mΩ; RoHS: Yes; ComponentLink1Description: Datasheet; ComponentLink1URL: https://wmsc.lcsc.com/wmsc/upload/file/pdf/v2/lcsc/2304140030_FH-BK-Guangdong-Fenghua-Bangke-Elec-BKW0805UCR12JGT_C98546.pdf; ComponentLink2Description: JLCPCB Part URL; ComponentLink2URL: https://jlcpcb.com/partdetail/C98546; ComponentLink3Description: LCSC Part URL; ComponentLink3URL: https://lcsc.com/product-detail/Inductors-SMD_FH-BKGuangdong-Fenghua-Bangke-Elec-FH-BKGuangdong-Fenghua-Bangke-Elec-BKW0805UCR12JGT_C98546.html
footprint IND-0805 (0805 (2012M) Inductor)
pins: 1, 2

## BKW0805UCR22JGT
designator L?  Inductance: 220nH
Inductor, 220nH, ±5%, 1.05Ω, 400mA, SMD 0805; Manufacturer: FH-BK(Guangdong Fenghua Bangke Elec); Manufacturer Part Number: BKW0805UCR22JGT; Package Size: 0805; JLCPCB Basic Part: No; JLCPCB Part Number: C98539; Supplier 1: LCSC; Category: Inductors; Supplier Part Number 1: C98539; Tolerance: ±5%; Rated Current: 400mA; DC Resistance: 1.05Ω; RoHS: Yes; ComponentLink1Description: Datasheet; ComponentLink1URL: https://wmsc.lcsc.com/wmsc/upload/file/pdf/v2/lcsc/2304140030_FH-BK-Guangdong-Fenghua-Bangke-Elec-BKW0805UCR22JGT_C98539.pdf; ComponentLink2Description: JLCPCB Part URL; ComponentLink2URL: https://jlcpcb.com/partdetail/C98539; ComponentLink3Description: LCSC Part URL; ComponentLink3URL: https://lcsc.com/product-detail/Inductors-SMD_FH-BKGuangdong-Fenghua-Bangke-Elec-FH-BKGuangdong-Fenghua-Bangke-Elec-BKW0805UCR22JGT_C98539.html
footprint IND-0805 (0805 (2012M) Inductor)
pins: 1, 2

## BKW0805UCR27JGT
designator L?  Inductance: 270nH
Inductor, 270nH, ±5%, 1Ω, 350mA, SMD 0805; Manufacturer: FH-BK(Guangdong Fenghua Bangke Elec); Manufacturer Part Number: BKW0805UCR27JGT; Package Size: 0805; JLCPCB Basic Part: No; JLCPCB Part Number: C98545; Supplier 1: LCSC; Category: Inductors; Supplier Part Number 1: C98545; Tolerance: ±5%; Rated Current: 350mA; DC Resistance: 1Ω; RoHS: Yes; ComponentLink1Description: Datasheet; ComponentLink1URL: https://wmsc.lcsc.com/wmsc/upload/file/pdf/v2/lcsc/2304140030_FH-BK-Guangdong-Fenghua-Bangke-Elec-BKW0805UCR27JGT_C98545.pdf; ComponentLink2Description: JLCPCB Part URL; ComponentLink2URL: https://jlcpcb.com/partdetail/C98545; ComponentLink3Description: LCSC Part URL; ComponentLink3URL: https://lcsc.com/product-detail/Inductors-SMD_FH-BKGuangdong-Fenghua-Bangke-Elec-FH-BKGuangdong-Fenghua-Bangke-Elec-BKW0805UCR27JGT_C98545.html
footprint IND-0805 (0805 (2012M) Inductor)
pins: 1, 2

## BKW0805UCR33JGT
designator L?  Inductance: 330nH
Inductor, 330nH, ±5%, 1.4Ω, 310mA, SMD 0805; Manufacturer: FH-BK(Guangdong Fenghua Bangke Elec); Manufacturer Part Number: BKW0805UCR33JGT; Package Size: 0805; JLCPCB Basic Part: No; JLCPCB Part Number: C316240; Supplier 1: LCSC; Category: Inductors; Supplier Part Number 1: C316240; Tolerance: ±5%; Rated Current: 310mA; DC Resistance: 1.4Ω; RoHS: Yes; ComponentLink1Description: Datasheet; ComponentLink1URL: https://wmsc.lcsc.com/wmsc/upload/file/pdf/v2/lcsc/2304140030_FH-BK-Guangdong-Fenghua-Bangke-Elec-BKW0805UCR33JGT_C316240.pdf; ComponentLink2Description: JLCPCB Part URL; ComponentLink2URL: https://jlcpcb.com/partdetail/C316240; ComponentLink3Description: LCSC Part URL; ComponentLink3URL: https://lcsc.com/product-detail/Inductors-SMD_FH-BKGuangdong-Fenghua-Bangke-Elec-FH-BKGuangdong-Fenghua-Bangke-Elec-BKW0805UCR33JGT_C316240.html
footprint IND-0805 (0805 (2012M) Inductor)
pins: 1, 2
